# Altium footprint library 我的器件.PCBLIB: 450 footprints (part 23 of 29)
Each footprint in its own frame and in the unit in brackets; x right, y up, seen from the top. Pads: shape width x height; smd on the part's side, far side on the other; paste and mask are expansions set on the pad; w line width, h text height; cw(c..) or ccw(c..) is an arc to the next point about the centre after c.
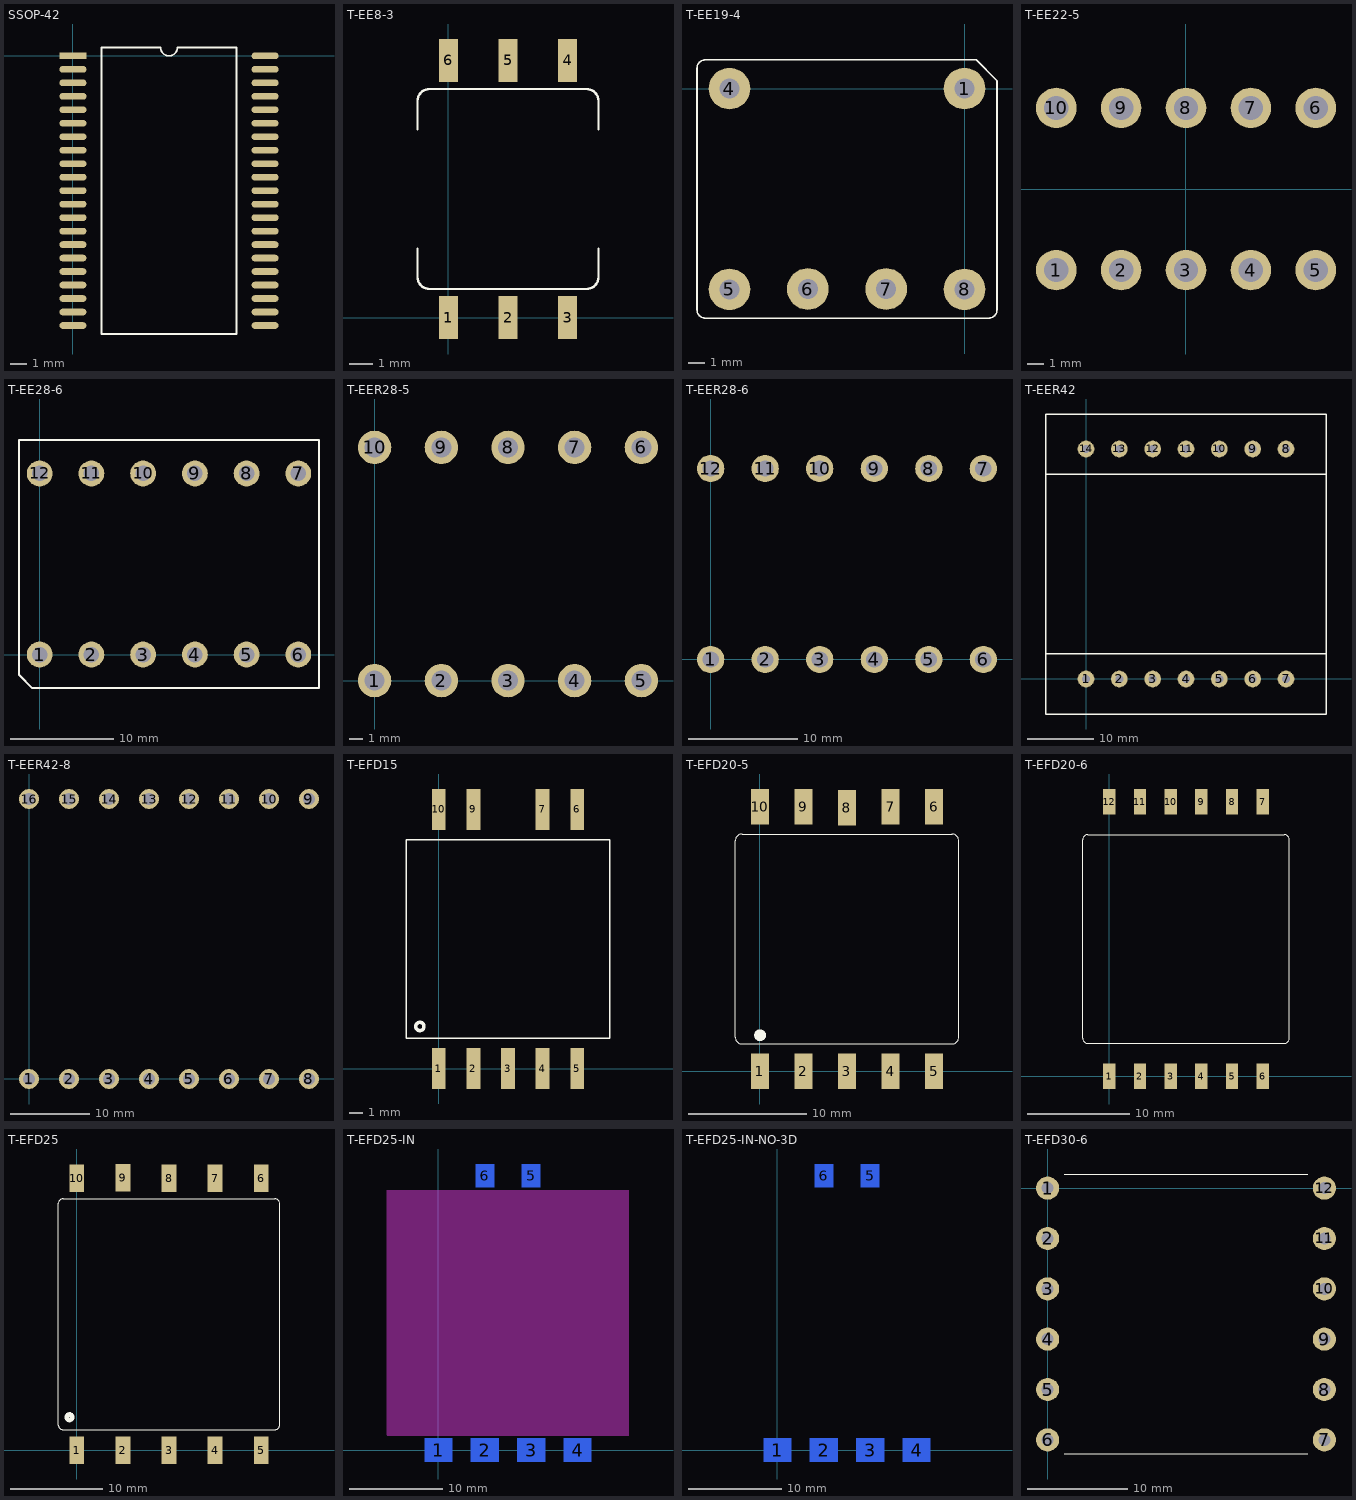
[diagram p22: the footprints below, top view; thin cyan lines are the x and y axes]

## SSOP-42 [mm]
pads (42):
  rect 1.6x0.4 smd: 1(0,0)
  oval 1.6x0.4 smd: 2(0,-0.8) 3(0,-1.6) 4(0,-2.4) 5(0,-3.2) 6(0,-4) 7(0,-4.8) 8(0,-5.6) 9(0,-6.4) 10(0,-7.2) 11(0,-8) 12(0,-8.8) 13(0,-9.6) 14(0,-10.4) 15(0,-11.2) 16(0,-12) 17(0,-12.8) 18(0,-13.6) 19(0,-14.4) 20(0,-15.2) 21(0,-16) 22(11.4,-16) 23(11.4,-15.2) 24(11.4,-14.4) 25(11.4,-13.6) 26(11.4,-12.8) 27(11.4,-12) 28(11.4,-11.2) 29(11.4,-10.4) 30(11.4,-9.6) 31(11.4,-8.8) 32(11.4,-8) 33(11.4,-7.2) 34(11.4,-6.4) 35(11.4,-5.6) 36(11.4,-4.8) 37(11.4,-4) 38(11.4,-3.2) 39(11.4,-2.4) 40(11.4,-1.6) 41(11.4,-0.8) 42(11.4,0)
Top Overlay:
  lines w0.1: 1.7,-16.5 9.7,-16.5 9.7,0.5 6.2,0.5 cw(c5.7,0.5) 5.7,0 cw(c5.7,0.5) 5.2,0.5 1.7,0.5 1.7,-16.5
3D body: height 1.1, standoff 0.9, extent 9.9,-0.2 10.5,0.201
3D body: height 1.1, standoff 0, extent 10.5,-0.2 10.7,0.2
3D body: height 0.2, standoff 0, extent 10.7,-0.2 11.7,0.2
3D body: height 0.2, standoff 0, extent 10.7,-1 11.7,-0.6
3D body: height 1.1, standoff 0, extent 10.5,-1 10.7,-0.6
3D body: height 1.1, standoff 0.9, extent 9.9,-1 10.5,-0.599
3D body: height 0.2, standoff 0, extent 10.7,-1.8 11.7,-1.4
3D body: height 1.1, standoff 0, extent 10.5,-1.8 10.7,-1.4
3D body: height 1.1, standoff 0.9, extent 9.9,-1.8 10.5,-1.399
3D body: height 0.2, standoff 0, extent 10.7,-2.6 11.7,-2.2
3D body: height 1.1, standoff 0, extent 10.5,-2.6 10.7,-2.2
3D body: height 1.1, standoff 0.9, extent 9.9,-2.6 10.5,-2.199
3D body: height 0.2, standoff 0, extent 10.7,-3.4 11.7,-3
3D body: height 1.1, standoff 0, extent 10.5,-3.4 10.7,-3
3D body: height 1.1, standoff 0.9, extent 9.9,-3.4 10.5,-2.999
3D body: height 1.1, standoff 0.9, extent 9.9,-7.4 10.5,-6.999
3D body: height 1.1, standoff 0, extent 10.5,-7.4 10.7,-7
3D body: height 0.2, standoff 0, extent 10.7,-7.4 11.7,-7
3D body: height 1.1, standoff 0.9, extent 9.9,-6.6 10.5,-6.199
3D body: height 1.1, standoff 0, extent 10.5,-6.6 10.7,-6.2
3D body: height 0.2, standoff 0, extent 10.7,-6.6 11.7,-6.2
3D body: height 1.1, standoff 0.9, extent 9.9,-5.8 10.5,-5.399
3D body: height 1.1, standoff 0, extent 10.5,-5.8 10.7,-5.4
3D body: height 0.2, standoff 0, extent 10.7,-5.8 11.7,-5.4
3D body: height 1.1, standoff 0.9, extent 9.9,-5 10.5,-4.599
3D body: height 1.1, standoff 0, extent 10.5,-5 10.7,-4.6
3D body: height 0.2, standoff 0, extent 10.7,-5 11.7,-4.6
3D body: height 0.2, standoff 0, extent 10.7,-4.2 11.7,-3.8
3D body: height 1.1, standoff 0, extent 10.5,-4.2 10.7,-3.8
3D body: height 1.1, standoff 0.9, extent 9.9,-4.2 10.5,-3.799
3D body: height 1.1, standoff 0.9, extent 9.9,-11.4 10.5,-10.999
3D body: height 1.1, standoff 0, extent 10.5,-11.4 10.7,-11
3D body: height 0.2, standoff 0, extent 10.7,-11.4 11.7,-11
3D body: height 1.1, standoff 0.9, extent 9.9,-10.6 10.5,-10.199
3D body: height 1.1, standoff 0, extent 10.5,-10.6 10.7,-10.2
3D body: height 0.2, standoff 0, extent 10.7,-10.6 11.7,-10.2
3D body: height 1.1, standoff 0.9, extent 9.9,-9.8 10.5,-9.399
3D body: height 1.1, standoff 0, extent 10.5,-9.8 10.7,-9.4
3D body: height 0.2, standoff 0, extent 10.7,-9.8 11.7,-9.4
3D body: height 1.1, standoff 0.9, extent 9.9,-9 10.5,-8.599
3D body: height 1.1, standoff 0, extent 10.5,-9 10.7,-8.6
3D body: height 0.2, standoff 0, extent 10.7,-9 11.7,-8.6
3D body: height 0.2, standoff 0, extent 10.7,-8.2 11.7,-7.8
3D body: height 1.1, standoff 0, extent 10.5,-8.2 10.7,-7.8
3D body: height 1.1, standoff 0.9, extent 9.9,-8.2 10.5,-7.799
3D body: height 1.1, standoff 0.9, extent 9.9,-15.4 10.5,-14.999
3D body: height 1.1, standoff 0, extent 10.5,-15.4 10.7,-15
3D body: height 0.2, standoff 0, extent 10.7,-15.4 11.7,-15
3D body: height 1.1, standoff 0.9, extent 9.9,-14.6 10.5,-14.199
3D body: height 1.1, standoff 0, extent 10.5,-14.6 10.7,-14.2
3D body: height 0.2, standoff 0, extent 10.7,-14.6 11.7,-14.2
3D body: height 1.1, standoff 0.9, extent 9.9,-13.8 10.5,-13.399
3D body: height 1.1, standoff 0, extent 10.5,-13.8 10.7,-13.4
3D body: height 0.2, standoff 0, extent 10.7,-13.8 11.7,-13.4
3D body: height 1.1, standoff 0.9, extent 9.9,-13 10.5,-12.599
3D body: height 1.1, standoff 0, extent 10.5,-13 10.7,-12.6
3D body: height 0.2, standoff 0, extent 10.7,-13 11.7,-12.6
3D body: height 0.2, standoff 0, extent 10.7,-12.2 11.7,-11.8
3D body: height 1.1, standoff 0, extent 10.5,-12.2 10.7,-11.8
3D body: height 1.1, standoff 0.9, extent 9.9,-12.2 10.5,-11.799
3D body: height 0.2, standoff 0, extent 10.7,-16.2 11.7,-15.8
3D body: height 1.1, standoff 0, extent 10.5,-16.2 10.7,-15.8
3D body: height 1.1, standoff 0.9, extent 9.9,-16.2 10.5,-15.799
3D body: height 1.1, standoff 0.9, extent 0.9,-16.2 1.5,-15.799
3D body: height 1.1, standoff 0, extent 0.7,-16.2 0.9,-15.8
3D body: height 0.2, standoff 0, extent -0.3,-16.2 0.7,-15.8
3D body: height 1.1, standoff 0.9, extent 0.9,-12.2 1.5,-11.799
3D body: height 1.1, standoff 0, extent 0.7,-12.2 0.9,-11.8
3D body: height 0.2, standoff 0, extent -0.3,-12.2 0.7,-11.8
3D body: height 0.2, standoff 0, extent -0.3,-13 0.7,-12.6
3D body: height 1.1, standoff 0, extent 0.7,-13 0.9,-12.6
3D body: height 1.1, standoff 0.9, extent 0.9,-13 1.5,-12.599
3D body: height 0.2, standoff 0, extent -0.3,-13.8 0.7,-13.4
3D body: height 1.1, standoff 0, extent 0.7,-13.8 0.9,-13.4
3D body: height 1.1, standoff 0.9, extent 0.9,-13.8 1.5,-13.399
3D body: height 0.2, standoff 0, extent -0.3,-14.6 0.7,-14.2
3D body: height 1.1, standoff 0, extent 0.7,-14.6 0.9,-14.2
3D body: height 1.1, standoff 0.9, extent 0.9,-14.6 1.5,-14.199
3D body: height 0.2, standoff 0, extent -0.3,-15.4 0.7,-15
3D body: height 1.1, standoff 0, extent 0.7,-15.4 0.9,-15
3D body: height 1.1, standoff 0.9, extent 0.9,-15.4 1.5,-14.999
3D body: height 1.1, standoff 0.9, extent 0.9,-8.2 1.5,-7.799
3D body: height 1.1, standoff 0, extent 0.7,-8.2 0.9,-7.8
3D body: height 0.2, standoff 0, extent -0.3,-8.2 0.7,-7.8
3D body: height 0.2, standoff 0, extent -0.3,-9 0.7,-8.6
3D body: height 1.1, standoff 0, extent 0.7,-9 0.9,-8.6
3D body: height 1.1, standoff 0.9, extent 0.9,-9 1.5,-8.599
3D body: height 0.2, standoff 0, extent -0.3,-9.8 0.7,-9.4
3D body: height 1.1, standoff 0, extent 0.7,-9.8 0.9,-9.4
3D body: height 1.1, standoff 0.9, extent 0.9,-9.8 1.5,-9.399
3D body: height 0.2, standoff 0, extent -0.3,-10.6 0.7,-10.2
3D body: height 1.1, standoff 0, extent 0.7,-10.6 0.9,-10.2
3D body: height 1.1, standoff 0.9, extent 0.9,-10.6 1.5,-10.199
3D body: height 0.2, standoff 0, extent -0.3,-11.4 0.7,-11
3D body: height 1.1, standoff 0, extent 0.7,-11.4 0.9,-11
3D body: height 1.1, standoff 0.9, extent 0.9,-11.4 1.5,-10.999
3D body: height 1.1, standoff 0.9, extent 0.9,-4.2 1.5,-3.799
3D body: height 1.1, standoff 0, extent 0.7,-4.2 0.9,-3.8
3D body: height 0.2, standoff 0, extent -0.3,-4.2 0.7,-3.8
3D body: height 0.2, standoff 0, extent -0.3,-5 0.7,-4.6
3D body: height 1.1, standoff 0, extent 0.7,-5 0.9,-4.6
3D body: height 1.1, standoff 0.9, extent 0.9,-5 1.5,-4.599
3D body: height 0.2, standoff 0, extent -0.3,-5.8 0.7,-5.4
3D body: height 1.1, standoff 0, extent 0.7,-5.8 0.9,-5.4
3D body: height 1.1, standoff 0.9, extent 0.9,-5.8 1.5,-5.399
3D body: height 0.2, standoff 0, extent -0.3,-6.6 0.7,-6.2
3D body: height 1.1, standoff 0, extent 0.7,-6.6 0.9,-6.2
3D body: height 1.1, standoff 0.9, extent 0.9,-6.6 1.5,-6.199
3D body: height 0.2, standoff 0, extent -0.3,-7.4 0.7,-7
3D body: height 1.1, standoff 0, extent 0.7,-7.4 0.9,-7
3D body: height 1.1, standoff 0.9, extent 0.9,-7.4 1.5,-6.999
3D body: height 1.1, standoff 0.9, extent 0.9,-3.4 1.5,-2.999
3D body: height 1.1, standoff 0, extent 0.7,-3.4 0.9,-3
3D body: height 0.2, standoff 0, extent -0.3,-3.4 0.7,-3
3D body: height 1.1, standoff 0.9, extent 0.9,-2.6 1.5,-2.199
3D body: height 1.1, standoff 0, extent 0.7,-2.6 0.9,-2.2
3D body: height 0.2, standoff 0, extent -0.3,-2.6 0.7,-2.2
3D body: height 1.1, standoff 0.9, extent 0.9,-1.8 1.5,-1.399
3D body: height 1.1, standoff 0, extent 0.7,-1.8 0.9,-1.4
3D body: height 0.2, standoff 0, extent -0.3,-1.8 0.7,-1.4
3D body: height 1.1, standoff 0.9, extent 0.9,-1 1.5,-0.599
3D body: height 1.1, standoff 0, extent 0.7,-1 0.9,-0.6
3D body: height 0.2, standoff 0, extent -0.3,-1 0.7,-0.6
3D body: height 0.2, standoff 0, extent -0.3,-0.2 0.7,0.2
3D body: height 1.1, standoff 0, extent 0.7,-0.2 0.9,0.2
3D body: height 1.1, standoff 0.9, extent 0.9,-0.2 1.5,0.201
3D body: height 2.1, standoff 0.1, extent 1.45,-16.75 9.95,0.75
3D body: height 2.11, standoff 2.1, extent 2.103,-0.799 2.9,-0.001

## T-EE8-3 [mm]
pads (6):
  rect 0.8x1.8 smd: 1(0,0) 2(2.5,0) 3(5,0) 4(5,10.8) 5(2.5,10.8) 6(0,10.8)
Top Overlay:
  lines w0.1: -1.3,2.9 -1.3,1.7 ccw(c-0.8,1.7) -0.8,1.2 5.8,1.2 ccw(c5.8,1.7) 6.3,1.7 6.3,2.9 ; -1.3,7.9 -1.3,9.1 cw(c-0.8,9.1) -0.8,9.6 5.8,9.6 cw(c5.8,9.1) 6.3,9.1 6.3,7.9
3D body: height 5.41, standoff 1.59, extent 5.675,5.375 6.725,5.425
3D body: height 5.41, standoff 1.59, extent -1.725,5.375 -0.675,5.425
3D body: height 6, standoff 1, extent 0.001,3.1 5.001,7.7
3D body: height 6.6, standoff 0.4, extent 0.601,3.1 4.399,7.7
3D body: height 1.6, standoff 0.4, extent 3.8,3.1 4.999,7.7
3D body: height 1.6, standoff 0.4, extent 0.001,3.1 1.2,7.7
3D body: height 6.6, standoff 5.4, extent 3.8,3.1 4.999,7.7
3D body: height 1.6, standoff 0.9, extent -1.8,0.9 6.8,3.1
3D body: height 0.9, standoff 0.2, extent -0.8,0.9 0.8,3.1
3D body: height 0.9, standoff 0.2, extent 1.8,0.9 3.2,3.1
3D body: height 0.9, standoff 0.2, extent 4.2,0.9 5.8,3.1
3D body: height 6.8, standoff 1.6, extent -0.3,2.6 5.3,3.1
3D body: height 6.6, standoff 5.4, extent 0.001,3.1 1.2,7.7
3D body: height 6.8, standoff 1.6, extent -0.3,7.7 5.3,8.2
3D body: height 0.9, standoff 0.2, extent -0.8,7.7 0.8,9.9
3D body: height 0.9, standoff 0.2, extent 1.8,7.7 3.2,9.9
3D body: height 0.9, standoff 0.2, extent 4.2,7.7 5.8,9.9
3D body: height 1.6, standoff 0.9, extent -1.8,7.7 6.8,9.9
3D body: height 1, standoff 0.7, extent 2.2,9.9 2.8,10.55
3D body: height 1, standoff 0, extent 2.2,10.4 2.8,10.7
3D body: height 0.3, standoff 0, extent 2.2,10.55 2.8,11.6
3D body: height 0.3, standoff 0, extent -0.3,10.55 0.3,11.6
3D body: height 1, standoff 0, extent -0.3,10.4 0.3,10.7
3D body: height 1, standoff 0.7, extent -0.3,9.9 0.3,10.55
3D body: height 0.3, standoff 0, extent 4.7,10.55 5.3,11.6
3D body: height 1, standoff 0, extent 4.7,10.4 5.3,10.7
3D body: height 1, standoff 0.7, extent 4.7,9.9 5.3,10.55
3D body: height 0.3, standoff 0, extent -0.3,-0.8 0.3,0.25
3D body: height 1, standoff 0, extent -0.3,0.1 0.3,0.4
3D body: height 1, standoff 0.7, extent -0.3,0.25 0.3,0.9
3D body: height 0.3, standoff 0, extent 2.2,-0.8 2.8,0.25
3D body: height 1, standoff 0, extent 2.2,0.1 2.8,0.4
3D body: height 1, standoff 0.7, extent 2.2,0.25 2.8,0.9
3D body: height 0.3, standoff 0, extent 4.7,-0.8 5.3,0.25
3D body: height 1, standoff 0, extent 4.7,0.1 5.3,0.4
3D body: height 1, standoff 0.7, extent 4.7,0.25 5.3,0.9
3D body: height 5.4, standoff 1.6, extent -1.7,1.2 6.7,5.4
3D body: height 5.4, standoff 1.6, extent -1.7,5.4 6.7,9.6

## T-EE19-4 [mm]
pads (6):
  round 2.5 hole 1.2: 1(0,0) 4(-14.1,0) 5(-14.1,-12.05) 6(-9.4,-12.025) 7(-4.7,-12.025) 8(0,-12.05)
Top Overlay:
  lines w0.1: -16.05,-13.275 ccw(c-15.55,-13.275) -15.55,-13.775 1.45,-13.775 ccw(c1.45,-13.275) 1.95,-13.275 1.95,0.475 0.7,1.725 -15.55,1.725 ccw(c-15.55,1.225) -16.05,1.225 -16.05,-13.275
3D body: height 14.45, standoff 1.5, extent -13.537,-10.525 -0.563,-1.525
3D body: height 1.4, standoff 0, extent -8.05,-11.525 -6.05,-10.525
3D body: height 1.4, standoff 0, extent -16.55,-11.525 -14.55,-10.525
3D body: height 1.4, standoff 0, extent -12.1,-11.525 -10.1,-10.525
3D body: height 1.4, standoff 0, extent -4,-11.525 -2,-10.525
3D body: height 1.4, standoff 0, extent 0.45,-11.525 2.45,-10.525
3D body: height 14.6, standoff 5.7, extent -13.75,-11.525 -0.35,-10.525
3D body: height 14.6, standoff 10.9, extent -13.75,-12.525 -0.35,-10.525
3D body: height 3, standoff -2, extent -14.398,-12.349 -13.8,-11.751
3D body: height 3, standoff -2, extent -9.697,-12.324 -9.1,-11.725
3D body: height 3, standoff -2, extent -4.997,-12.324 -4.4,-11.725
3D body: height 3, standoff -2, extent -0.297,-12.349 0.3,-11.75
3D body: height 3, standoff -2, extent -14.4,-0.3 -13.803,0.299
3D body: height 3, standoff -2, extent -0.3,-0.299 0.298,0.299
3D body: height 14.6, standoff 10.9, extent -13.75,-1.525 -0.35,0.475
3D body: height 14.6, standoff 5.7, extent -13.75,-1.525 -0.35,-0.525
3D body: height 1.4, standoff 0, extent -16.55,-1.525 -14.55,-0.525
3D body: height 1.4, standoff 0, extent -12.1,-1.525 -10.1,-0.525
3D body: height 1.4, standoff 0, extent -4,-1.525 -2,-0.525
3D body: height 1.4, standoff 0, extent 0.45,-1.525 2.45,-0.525
3D body: height 1.4, standoff 0, extent -8.05,-1.525 -6.05,-0.525
3D body: height 10.3, standoff 5.9, extent -16.55,-6.025 2.45,2.175
3D body: height 10.3, standoff 5.9, extent -16.55,-14.225 2.45,-6.025
3D body: height 10.31, standoff 5.89, extent 0.125,-6.05 2.475,-6
3D body: height 10.31, standoff 5.89, extent -16.575,-6.05 -14.225,-6
3D body: height 5.7, standoff 1.4, extent -16.55,-13.925 2.45,-10.525
3D body: height 5.7, standoff 1.4, extent -16.55,-1.525 2.45,1.875

## T-EE22-5 [mm]
pads (10):
  round 2.5 hole 1.5: 1(-8,-5) 2(-4,-5) 3(0,-5) 4(4,-5) 5(8,-5) 6(8,5) 7(4,5) 8(0,5) 9(-4,5) 10(-8,5)
3D body: height 19.3, standoff 16.8, extent -6.65,3.004 6.556,6.51
3D body: height 19.3, standoff 16.8, extent -6.65,-6.696 6.55,-3.196
3D body: height 17, standoff 16.8, extent -6.65,-6.696 6.55,6.504
3D body: height 16.8, standoff 7.7, extent -6.25,-6.25 6.25,6.25
3D body: height 21, standoff 17, extent -11.25,-3 11.25,3
3D body: height 7.8, standoff 3.2, extent -11.1,-8 11.1,8
3D body: height 5.2, standoff 1.2, extent -11.25,-3 11.25,3
3D body: height 19, standoff 1.2, extent -11.25,-3 -8.25,3
3D body: height 19, standoff 1.2, extent 8.25,-3 11.25,3
3D body: height 3, standoff -2, extent -8.496,-5.499 -7.5,-4.501
3D body: height 3, standoff -2, extent -4.496,-5.499 -3.5,-4.501
3D body: height 3, standoff -2, extent -0.496,-5.499 0.5,-4.501
3D body: height 3, standoff -2, extent 3.504,-5.499 4.5,-4.501
3D body: height 3, standoff -2, extent 7.504,-5.499 8.5,-4.501
3D body: height 3, standoff -2, extent 7.504,4.501 8.5,5.499
3D body: height 3, standoff -2, extent 3.504,4.501 4.5,5.499
3D body: height 3, standoff -2, extent -0.496,4.501 0.5,5.499
3D body: height 3, standoff -2, extent -4.496,4.501 -3.5,5.499
3D body: height 3, standoff -2, extent -8.496,4.501 -7.5,5.499
3D body: height 3.2, standoff 0, extent -11.1,-3.7 11.1,-3.1
3D body: height 3.2, standoff 0, extent -11.1,3.1 11.1,3.7
3D body: height 21.1, standoff 21, extent -11.25,-3 11.25,3
3D body: height 21.1, standoff 0, extent -11.35,-3 -11.25,3
3D body: height 21.1, standoff 0, extent 11.25,-3 11.35,3
3D body: height 0.09, standoff -0.01, extent -11.25,-3 11.25,3

## T-EE28-6 [mm]
height 28
pads (12):
  round 2.5 hole 1.5: 1(0,0) 2(5,0) 3(10,0) 4(15,0) 5(20,0) 6(25,0) 7(25,17.5) 8(20,17.5) 9(15,17.5) 10(10,17.5) 11(5,17.5) 12(0,17.5)
Top Overlay:
  lines w0.2: -2,-1.958 -0.708,-3.25 27,-3.25 27,20.75 -2,20.75 -2,-1.958

## T-EER28-5 [mm]
pads (10):
  round 2.5 hole 1.5: 1(0,0) 2(5,0) 3(10,0) 4(15,0) 5(20,0) 6(20,17.5) 7(15,17.5) 8(10,17.5) 9(5,17.5) 10(0,17.5)
3D body: height 3, standoff -2, extent -0.496,-0.499 0.5,0.499
3D body: height 3, standoff -2, extent 4.504,-0.499 5.5,0.499
3D body: height 3, standoff -2, extent 9.504,-0.499 10.5,0.499
3D body: height 3, standoff -2, extent 14.504,-0.499 15.5,0.499
3D body: height 3, standoff -2, extent 19.504,-0.499 20.5,0.499
3D body: height 3, standoff -2, extent 19.504,17.001 20.5,17.999
3D body: height 3, standoff -2, extent 14.504,17.001 15.5,17.999
3D body: height 3, standoff -2, extent 9.504,17.001 10.5,17.999
3D body: height 3, standoff -2, extent 4.504,17.001 5.5,17.999
3D body: height 3, standoff -2, extent -0.496,17.001 0.5,17.999
3D body: height 4.5, standoff 0, extent -5.325,2.5 25.275,15
3D body: height 35, standoff 0, extent 20.775,2.5 25.275,15
3D body: height 35, standoff 0, extent -5.325,2.5 -0.825,15
3D body: height 35, standoff 30.5, extent -5.325,2.5 25.275,15
3D body: height 30.5, standoff 28.5, extent -0.417,-1.729 20.5,19.229
3D body: height 29, standoff 7, extent 1.071,-0.232 19,17.732
3D body: height 35.1, standoff 35, extent -5.325,2.5 25.275,15
3D body: height 35.1, standoff 0, extent -5.425,2.5 -5.325,15
3D body: height 35.1, standoff 0, extent 25.275,2.5 25.375,15
3D body: height 0, standoff -0.1, extent -5.4,2.5 25.4,15
3D body: height 6.7, standoff 2, extent -5,-4.35 25,21.85

## T-EER28-6 [mm]
pads (12):
  round 2.5 hole 1.5: 1(0,0) 2(5,0) 3(10,0) 4(15,0) 5(20,0) 6(25,0) 7(25,17.5) 8(20,17.5) 9(15,17.5) 10(10,17.5) 11(5,17.5) 12(0,17.5)
3D body: height 6.7, standoff 2, extent -2.7,-4.55 27.7,22.05
3D body: height 3, standoff -2, extent -0.496,-0.499 0.5,0.499
3D body: height 3, standoff -2, extent 4.504,-0.499 5.5,0.499
3D body: height 3, standoff -2, extent 9.504,-0.499 10.5,0.499
3D body: height 3, standoff -2, extent 14.504,-0.499 15.5,0.499
3D body: height 3, standoff -2, extent 19.504,-0.499 20.5,0.499
3D body: height 3, standoff -2, extent 24.504,-0.499 25.5,0.499
3D body: height 3, standoff -2, extent 24.504,17.001 25.5,17.999
3D body: height 3, standoff -2, extent 19.504,17.001 20.5,17.999
3D body: height 3, standoff -2, extent 14.504,17.001 15.5,17.999
3D body: height 3, standoff -2, extent 9.504,17.001 10.5,17.999
3D body: height 3, standoff -2, extent 4.504,17.001 5.5,17.999
3D body: height 3, standoff -2, extent -0.496,17.001 0.5,17.999
3D body: height 4.5, standoff 0, extent -2.8,2.55 27.8,15.05
3D body: height 35, standoff 0, extent -2.8,2.55 1.7,15.05
3D body: height 35, standoff 0, extent 23.3,2.55 27.8,15.05
3D body: height 35, standoff 30.5, extent -2.8,2.55 27.8,15.05
3D body: height 30.5, standoff 28.5, extent 2.083,-1.729 23,19.229
3D body: height 29, standoff 7, extent 3.571,-0.232 21.5,17.732
3D body: height 35.1, standoff 35, extent -2.8,2.55 27.8,15.05
3D body: height 35.1, standoff 0, extent -2.9,2.55 -2.8,15.05
3D body: height 35.1, standoff 0, extent 27.8,2.55 27.9,15.05
3D body: height 0, standoff -0.1, extent -2.9,2.55 27.9,15.05

## T-EER42 [mm]
height 35
pads (14):
  round 2.5 hole 1.2: 1(0,0) 2(5,0) 3(10,0) 4(15,0) 5(20,0) 6(25,0) 7(30,0) 8(30,34.5) 9(25,34.5) 10(20,34.5) 11(15,34.5) 12(10,34.5) 13(5,34.5) 14(0,34.5)
Top Overlay:
  lines w0.2: -6,3.788 36,3.788 ; -6,30.712 36,30.712 ; -6,-5.25 36,-5.25 36,39.75 -6,39.75 -6,-5.25

## T-EER42-8 [mm]
pads (16):
  round 2.5 hole 1.5: 1(0,0) 2(5,0) 3(10,0) 4(15,0) 5(20,0) 6(25,0) 7(30,0) 8(35,0) 9(35,35) 10(30,35) 11(25,35) 12(20,35) 13(15,35) 14(10,35) 15(5,35) 16(0,35)
3D body: height 28, standoff 13.3, extent -4.9,40.2 39.9,40.3
3D body: height 28, standoff 13.3, extent -4.9,-5.3 39.9,-5.2
3D body: height 28, standoff 13.3, extent -4.9,-5.2 -4.8,40.2
3D body: height 13, standoff 0, extent -2,31.5 0.75,34.2
3D body: height 13, standoff 0, extent 34.3,31.5 37,34.25
3D body: height 28, standoff 13.3, extent 39.8,-5.2 39.9,40.2
3D body: height 35.27, standoff 7.33, extent 3.555,31.6 31.445,32.6
3D body: height 27.79, standoff 14.81, extent 10.926,1.8 23.874,33.2
3D body: height 28, standoff 13.3, extent -4.8,-5.2 39.8,40.2
3D body: height 13, standoff 8.5, extent -2,-2 37,3.5
3D body: height 8.5, standoff 5, extent 33,-2 37,3.5
3D body: height 5, standoff -2, extent 34.603,-0.399 35.4,0.399
3D body: height 8.5, standoff 5, extent 28,-2 32,3.5
3D body: height 5, standoff -2, extent 29.603,-0.399 30.4,0.399
3D body: height 8.5, standoff 5, extent 23,-2 27,3.5
3D body: height 5, standoff -2, extent 24.603,-0.399 25.4,0.399
3D body: height 8.5, standoff 5, extent 18,-2 22,3.5
3D body: height 5, standoff -2, extent 19.603,-0.399 20.4,0.399
3D body: height 8.5, standoff 5, extent 13,-2 17,3.5
3D body: height 5, standoff -2, extent 14.603,-0.399 15.4,0.399
3D body: height 8.5, standoff 5, extent 8,-2 12,3.5
3D body: height 5, standoff -2, extent 9.603,-0.399 10.4,0.399
3D body: height 8.5, standoff 5, extent 3,-2 7,3.5
3D body: height 5, standoff -2, extent 4.603,-0.399 5.4,0.399
3D body: height 5, standoff -2, extent -0.397,-0.399 0.4,0.399
3D body: height 8.5, standoff 5, extent -2,-2 2,3.5
3D body: height 13, standoff 11.5, extent -2,-4.5 37,3.5
3D body: height 13, standoff 0, extent -2,0.75 0.7,3.5
3D body: height 35.27, standoff 7.33, extent 3.555,2.5 31.445,3.5
3D body: height 13, standoff 11.5, extent -2,31.5 37,39.5
3D body: height 8.5, standoff 5, extent 33,31.5 37,37
3D body: height 5, standoff -2, extent 34.6,34.601 35.397,35.399
3D body: height 5, standoff -2, extent 29.6,34.601 30.397,35.399
3D body: height 8.5, standoff 5, extent 28,31.5 32,37
3D body: height 5, standoff -2, extent 24.6,34.601 25.397,35.399
3D body: height 8.5, standoff 5, extent 23,31.5 27,37
3D body: height 5, standoff -2, extent 19.6,34.601 20.397,35.399
3D body: height 8.5, standoff 5, extent 18,31.5 22,37
3D body: height 5, standoff -2, extent 14.6,34.601 15.397,35.399
3D body: height 8.5, standoff 5, extent 13,31.5 17,37
3D body: height 5, standoff -2, extent 9.6,34.601 10.397,35.399
3D body: height 8.5, standoff 5, extent 8,31.5 12,37
3D body: height 5, standoff -2, extent 4.6,34.601 5.397,35.399
3D body: height 8.5, standoff 5, extent 3,31.5 7,37
3D body: height 5, standoff -2, extent -0.4,34.601 0.397,35.399
3D body: height 8.5, standoff 5, extent -2,31.5 2,37
3D body: height 13, standoff 8.5, extent -2,31.5 37,37
3D body: height 33.28, standoff 9.32, extent 5.547,3.5 29.453,31.5
3D body: height 28.1, standoff 15.4, extent 31.5,17.4 39.8,17.6
3D body: height 28.1, standoff 15.4, extent -4.8,17.4 3.5,17.6
3D body: height 13, standoff 0, extent 34.25,0.8 37,3.5

## T-EFD15 [mm] "SMD"
height 8
pads (9):
  rect 1x3 smd: 1(0,0) 2(2.54,0) 3(5.08,0) 4(7.62,0) 5(10.16,0) 6(10.16,19.069) 7(7.62,19.069) 9(2.54,19.069) 10(0,19.069)
Top Overlay:
  circle w0.254: c-1.404,3.1 r0.304
  lines w0.1: -2.42,2.234 -2.42,16.835 -1.92,16.835 12.58,16.835 12.58,2.234 -2.42,2.234
3D body: height 8, standoff 3.2, extent -2.945,17.334 13.105,17.36
3D body: height 8, standoff 3.2, extent -2.945,1.709 13.105,1.734
3D body: height 8, standoff 3.2, extent -2.945,1.734 -2.92,17.334
3D body: height 8, standoff 1, extent -0.02,13.934 10.18,14.634
3D body: height 8, standoff 1, extent -0.02,4.434 10.18,5.134
3D body: height 7, standoff 5.5, extent 2.88,15.234 7.28,17.334
3D body: height 7, standoff 5.5, extent 2.88,1.734 7.28,3.835
3D body: height 8, standoff 5.5, extent 7.28,1.734 13.08,17.334
3D body: height 8, standoff 5.5, extent -2.92,1.734 2.88,17.334
3D body: height 5.5, standoff 3.2, extent -2.92,1.734 13.08,17.334
3D body: height 0.5, standoff 0, extent -0.3,-1.2 0.3,0.8
3D body: height 2.5, standoff 0, extent -0.3,0.8 0.3,1.3
3D body: height 2.5, standoff 2, extent -0.3,1.3 0.3,3.103
3D body: height 3.2, standoff 1, extent -1.57,2.134 11.73,5.134
3D body: height 3.2, standoff 1, extent -1.57,13.934 11.73,16.934
3D body: height 2.5, standoff 2, extent -0.3,15.966 0.3,17.769
3D body: height 2.5, standoff 0, extent -0.3,17.769 0.3,18.269
3D body: height 0.5, standoff 0, extent -0.3,18.269 0.3,20.269
3D body: height 2.5, standoff 2, extent 2.24,15.966 2.84,17.769
3D body: height 2.5, standoff 0, extent 2.24,17.769 2.84,18.269
3D body: height 0.5, standoff 0, extent 2.24,18.269 2.84,20.269
3D body: height 2.5, standoff 2, extent 7.32,15.966 7.92,17.769
3D body: height 2.5, standoff 0, extent 7.32,17.769 7.92,18.269
3D body: height 0.5, standoff 0, extent 7.32,18.269 7.92,20.269
3D body: height 2.5, standoff 2, extent 9.86,15.966 10.46,17.769
3D body: height 2.5, standoff 0, extent 9.86,17.769 10.46,18.269
3D body: height 0.5, standoff 0, extent 9.86,18.269 10.46,20.269
3D body: height 2.5, standoff 2, extent 2.24,1.3 2.84,3.103
3D body: height 2.5, standoff 0, extent 2.24,0.8 2.84,1.3
3D body: height 0.5, standoff 0, extent 2.24,-1.2 2.84,0.8
3D body: height 2.5, standoff 2, extent 4.78,1.3 5.38,3.103
3D body: height 2.5, standoff 0, extent 4.78,0.8 5.38,1.3
3D body: height 0.5, standoff 0, extent 4.78,-1.2 5.38,0.8
3D body: height 2.5, standoff 2, extent 7.32,1.3 7.92,3.103
3D body: height 2.5, standoff 0, extent 7.32,0.8 7.92,1.3
3D body: height 0.5, standoff 0, extent 7.32,-1.2 7.92,0.8
3D body: height 2.5, standoff 2, extent 9.86,1.3 10.46,3.103
3D body: height 2.5, standoff 0, extent 9.86,0.8 10.46,1.3
3D body: height 0.5, standoff 0, extent 9.86,-1.2 10.46,0.8
3D body: height 7.79, standoff 1.01, extent 0.68,5.135 7.453,13.935
3D body: height 7.79, standoff 1.01, extent 2.707,5.135 9.48,13.935
3D body: height 7.8, standoff 1, extent 4.067,5.134 6.093,13.934
3D body: height 8, standoff 3.2, extent 13.08,1.734 13.105,17.334
3D body: height 8.01, standoff 3.19, extent 10.955,9.484 13.08,9.585
3D body: height 8.01, standoff 3.19, extent -2.92,9.484 -0.795,9.585

## T-EFD20-5 [mm]
pads (10):
  rect 1.5x3 smd: 1(0,0) 2(3.7,0) 3(7.4,0) 4(11.1,0) 5(14.8,0) 6(14.8,22.5) 7(11.1,22.5) 8(7.4,22.4) 9(3.7,22.5) 10(0,22.5)
Top Overlay:
  circle w0.5: c0.013,3.071 r0.25
  lines w0.1: -1.515,2.335 cw(c-1.515,2.919) -2.1,2.919 -2.1,19.581 cw(c-1.515,19.581) -1.515,20.165 16.341,20.165 ; -1.49,2.335 16.315,2.335 ccw(c16.315,2.919) 16.9,2.919 16.9,19.581 ccw(c16.315,19.581) 16.315,20.165
3D body: height 1.5, standoff 0, extent -0.5,0.346 0.504,0.848
3D body: height 1.5, standoff 1, extent -0.5,0.847 0.5,1.6
3D body: height 0.5, standoff 0, extent -0.5,-1.254 0.504,0.348
3D body: height 9.8, standoff 2.8, extent -0.3,4.25 15.1,5.25
3D body: height 9.4, standoff 2.8, extent 0.9,5.25 13.9,17.25
3D body: height 2.8, standoff 0, extent -3.4,1.55 18.2,4.55
3D body: height 9.8, standoff 2.8, extent -3.4,1.55 18.2,20.95
3D body: height 9.8, standoff 2.8, extent -0.3,17.25 15.1,18.25
3D body: height 2.8, standoff 0, extent -3.4,17.95 18.2,20.95
3D body: height 0.5, standoff 0, extent 3.2,-1.254 4.204,0.348
3D body: height 1.5, standoff 1, extent 3.2,0.847 4.2,1.6
3D body: height 1.5, standoff 0, extent 3.2,0.346 4.204,0.848
3D body: height 0.5, standoff 0, extent 6.9,-1.254 7.904,0.348
3D body: height 1.5, standoff 1, extent 6.9,0.847 7.9,1.6
3D body: height 1.5, standoff 0, extent 6.9,0.346 7.904,0.848
3D body: height 0.5, standoff 0, extent 10.6,-1.254 11.604,0.348
3D body: height 1.5, standoff 1, extent 10.6,0.847 11.6,1.6
3D body: height 1.5, standoff 0, extent 10.6,0.346 11.604,0.848
3D body: height 0.5, standoff 0, extent 14.3,-1.254 15.304,0.348
3D body: height 1.5, standoff 1, extent 14.3,0.847 15.3,1.6
3D body: height 1.5, standoff 0, extent 14.3,0.346 15.304,0.848
3D body: height 0.5, standoff 0, extent 14.296,22.152 15.3,23.754
3D body: height 1.5, standoff 1, extent 14.3,20.9 15.3,21.653
3D body: height 1.5, standoff 0, extent 14.296,21.652 15.3,22.154
3D body: height 0.5, standoff 0, extent 10.596,22.152 11.6,23.754
3D body: height 1.5, standoff 1, extent 10.6,20.9 11.6,21.653
3D body: height 1.5, standoff 0, extent 10.596,21.652 11.6,22.154
3D body: height 0.5, standoff 0, extent 6.896,22.052 7.9,23.654
3D body: height 1.5, standoff 1, extent 6.9,20.8 7.9,21.553
3D body: height 1.5, standoff 0, extent 6.896,21.552 7.9,22.054
3D body: height 0.5, standoff 0, extent 3.196,22.152 4.2,23.754
3D body: height 1.5, standoff 1, extent 3.2,20.9 4.2,21.653
3D body: height 1.5, standoff 0, extent 3.196,21.652 4.2,22.154
3D body: height 0.5, standoff 0, extent -0.504,22.152 0.5,23.754
3D body: height 1.5, standoff 1, extent -0.5,20.9 0.5,21.653
3D body: height 1.5, standoff 0, extent -0.504,21.652 0.5,22.154

## T-EFD20-6 [mm]
pads (12):
  rect 1.2x2.5 smd: 1(0,0) 2(3,0) 3(6,0) 4(9,0) 5(12,0) 6(15,0) 7(15,26.8) 8(12,26.8) 9(9,26.8) 10(6,26.8) 11(3,26.8) 12(0,26.8)
Top Overlay:
  lines w0.1: -2.6,3.7 ccw(c-2.1,3.7) -2.1,3.2 17.1,3.2 ccw(c17.1,3.7) 17.6,3.7 17.6,23.1 ccw(c17.1,23.1) 17.1,23.6 -2.1,23.6 ccw(c-2.1,23.1) -2.6,23.1 -2.6,3.7
3D body: height 10, standoff 3.6, extent 10.2,2.9 18,23.9
3D body: height 8, standoff 3.6, extent 4.8,2.9 10.2,5.3
3D body: height 7, standoff 4.6, extent 3.1,5.3 11.9,21.5
3D body: height 8, standoff 3.6, extent 4.8,21.5 10.2,23.9
3D body: height 10, standoff 3.6, extent -3,2.9 4.8,23.9
3D body: height 10, standoff 1, extent 5,6.4 10,20.4
3D body: height 9.96, standoff 1, extent 5.509,6.4 14.491,20.4
3D body: height 3.5, standoff 1.7, extent -2.55,20.371 17.55,23.898
3D body: height 1.95, standoff 0, extent 11.7,25.2 12.3,25.5
3D body: height 0.35, standoff 0, extent 11.7,25.5 12.3,27.9
3D body: height 1.95, standoff 1.6, extent 11.7,23.1 12.3,25.2
3D body: height 1.95, standoff 0, extent 8.7,25.2 9.3,25.5
3D body: height 0.35, standoff 0, extent 8.7,25.5 9.3,27.9
3D body: height 1.95, standoff 1.6, extent 8.7,23.1 9.3,25.2
3D body: height 1.95, standoff 0, extent 5.7,25.2 6.3,25.5
3D body: height 0.35, standoff 0, extent 5.7,25.5 6.3,27.9
3D body: height 1.95, standoff 1.6, extent 5.7,23.1 6.3,25.2
3D body: height 1.95, standoff 0, extent 2.7,25.2 3.3,25.5
3D body: height 0.35, standoff 0, extent 2.7,25.5 3.3,27.9
3D body: height 1.95, standoff 1.6, extent 2.7,23.1 3.3,25.2
3D body: height 1.95, standoff 0, extent -0.3,25.2 0.3,25.5
3D body: height 0.35, standoff 0, extent -0.3,25.5 0.3,27.9
3D body: height 1.95, standoff 1.6, extent -0.3,23.1 0.3,25.2
3D body: height 10.5, standoff 3.5, extent 0.2,20.367 14.8,20.867
3D body: height 1.7, standoff 0.5, extent 11.1,20.4 12.908,23.904
3D body: height 1.7, standoff 0.5, extent 8.1,20.4 9.908,23.904
3D body: height 1.7, standoff 0.5, extent 5.1,20.4 6.908,23.904
3D body: height 1.7, standoff 0.5, extent 2.1,20.4 3.908,23.904
3D body: height 1.7, standoff 0.5, extent -0.9,20.4 0.908,23.904
3D body: height 1.7, standoff 0.5, extent 14.092,2.896 15.9,6.4
3D body: height 1.7, standoff 0.5, extent 11.092,2.896 12.9,6.4
3D body: height 1.7, standoff 0.5, extent 8.092,2.896 9.9,6.4
3D body: height 1.7, standoff 0.5, extent 5.092,2.896 6.9,6.4
3D body: height 1.7, standoff 0.5, extent 2.092,2.896 3.9,6.4
3D body: height 9.96, standoff 1, extent 0.509,6.4 9.491,20.4
3D body: height 10.5, standoff 3.5, extent 0.2,5.933 14.8,6.433
3D body: height 1.95, standoff 1.6, extent 14.7,1.6 15.3,3.7
3D body: height 0.35, standoff 0, extent 14.7,-1.1 15.3,1.3
3D body: height 1.95, standoff 0, extent 14.7,1.3 15.3,1.6
3D body: height 1.95, standoff 1.6, extent 11.7,1.6 12.3,3.7
3D body: height 0.35, standoff 0, extent 11.7,-1.1 12.3,1.3
3D body: height 1.95, standoff 0, extent 11.7,1.3 12.3,1.6
3D body: height 1.95, standoff 1.6, extent 8.7,1.6 9.3,3.7
3D body: height 0.35, standoff 0, extent 8.7,-1.1 9.3,1.3
3D body: height 1.95, standoff 0, extent 8.7,1.3 9.3,1.6
3D body: height 1.95, standoff 1.6, extent 5.7,1.6 6.3,3.7
3D body: height 0.35, standoff 0, extent 5.7,-1.1 6.3,1.3
3D body: height 1.95, standoff 0, extent 5.7,1.3 6.3,1.6
3D body: height 1.95, standoff 1.6, extent 2.7,1.6 3.3,3.7
3D body: height 0.35, standoff 0, extent 2.7,-1.1 3.3,1.3
3D body: height 1.95, standoff 0, extent 2.7,1.3 3.3,1.6
3D body: height 3.5, standoff 1.7, extent -2.55,2.902 17.55,6.429
3D body: height 1.95, standoff 1.6, extent -0.3,1.6 0.3,3.7
3D body: height 0.35, standoff 0, extent -0.3,-1.1 0.3,1.3
3D body: height 1.95, standoff 0, extent -0.3,1.3 0.3,1.6
3D body: height 1.7, standoff 0.5, extent -0.908,2.896 0.9,6.4
3D body: height 1.7, standoff 0.5, extent 14.1,20.4 15.908,23.904
3D body: height 1.95, standoff 0, extent 14.7,25.2 15.3,25.5
3D body: height 0.35, standoff 0, extent 14.7,25.5 15.3,27.9
3D body: height 1.95, standoff 1.6, extent 14.7,23.1 15.3,25.2

## T-EFD25 [mm]
height 12.8
pads (10):
  rect 1.6x3 smd: 1(0,0) 2(5,0) 3(10,0) 4(15,0) 5(20,0) 6(20,29.5) 7(15,29.5) 8(10,29.5) 9(5,29.55) 10(0,29.5)
Top Overlay:
  circle w0.5: c-0.8,3.575 r0.3
  lines w0.1: -2,2.725 ccw(c-1.5,2.725) -1.5,2.225 21.5,2.225 ccw(c21.5,2.725) 22,2.725 22,26.775 ccw(c21.5,26.775) 21.5,27.275 -1.5,27.275 ccw(c-1.5,26.775) -2,26.775 -2,2.725
3D body: height 4, standoff 2.5, extent -2.4,1.88 22.5,6.38
3D body: height 13.5, standoff 4, extent 1.05,5.581 19.05,6.381
3D body: height 13, standoff 1.5, extent 4.5,6.375 15.5,23.175
3D body: height 2.5, standoff 1, extent 8.5,1.875 11.5,6.375
3D body: height 2.5, standoff 1, extent -2.405,1.88 1.6,6.38
3D body: height 2.5, standoff 1, extent 18.5,1.88 22.505,6.38
3D body: height 2.5, standoff 1, extent 3.5,1.88 6.5,6.38
3D body: height 2.5, standoff 1, extent 13.6,1.88 16.6,6.38
3D body: height 0.4, standoff 0, extent 9.5,-1.125 10.5,0.375
3D body: height 2.5, standoff 0, extent 9.5,0.375 10.5,0.775
3D body: height 2.5, standoff 2.1, extent 9.5,0.775 10.5,1.875
3D body: height 2.5, standoff 2.1, extent 4.5,0.78 5.5,1.88
3D body: height 2.5, standoff 0, extent 4.5,0.38 5.5,0.78
3D body: height 0.4, standoff 0, extent 4.5,-1.12 5.5,0.38
3D body: height 2.5, standoff 2.1, extent 14.5,0.78 15.5,1.88
3D body: height 2.5, standoff 0, extent 14.5,0.38 15.5,0.78
3D body: height 0.4, standoff 0, extent 14.5,-1.12 15.5,0.38
3D body: height 0.4, standoff 0, extent 19.5,-1.115 20.5,0.385
3D body: height 2.5, standoff 0, extent 19.5,0.385 20.5,0.785
3D body: height 2.5, standoff 2.1, extent 19.5,0.785 20.5,1.885
3D body: height 0.4, standoff 0, extent -0.5,-1.115 0.5,0.385
3D body: height 2.5, standoff 0, extent -0.5,0.385 0.5,0.785
3D body: height 2.5, standoff 2.1, extent -0.5,0.785 0.5,1.885
3D body: height 2.5, standoff 1, extent 3.45,23.18 6.45,27.68
3D body: height 2.5, standoff 1, extent 13.55,23.18 16.55,27.68
3D body: height 2.5, standoff 1, extent 18.45,23.18 22.455,27.68
3D body: height 2.5, standoff 1, extent 8.55,23.185 11.55,27.685
3D body: height 13.5, standoff 4, extent 1,23.179 19,23.979
3D body: height 4, standoff 2.5, extent -2.45,23.18 22.45,27.68
3D body: height 12.98, standoff 7, extent 1.506,6.375 7.494,23.175
3D body: height 12.98, standoff 7, extent 12.506,6.375 18.494,23.175
3D body: height 7.48, standoff 1.5, extent 12.506,6.375 18.494,23.175
3D body: height 10, standoff 4.5, extent 1.5,6.375 18.5,23.175
3D body: height 7.48, standoff 1.5, extent 1.506,6.375 7.494,23.175
3D body: height 12, standoff 4, extent -2.8,1.975 22.8,27.575
3D body: height 13.5, standoff 12, extent -2.8,1.975 6.7,27.575
3D body: height 13.5, standoff 12, extent 13.3,1.975 22.8,27.575
3D body: height 10, standoff 5, extent 3.5,5.375 16.5,24.175
3D body: height 0.4, standoff 0, extent 9.5,29.175 10.5,30.675
3D body: height 2.5, standoff 0, extent 9.5,28.775 10.5,29.175
3D body: height 2.5, standoff 2.1, extent 9.5,27.675 10.5,28.775
3D body: height 2.5, standoff 2.1, extent 14.5,27.67 15.5,28.77
3D body: height 2.5, standoff 0, extent 14.5,28.77 15.5,29.17
3D body: height 0.4, standoff 0, extent 14.5,29.17 15.5,30.67
3D body: height 2.5, standoff 2.1, extent 4.5,27.67 5.5,28.77
3D body: height 2.5, standoff 0, extent 4.5,28.77 5.5,29.17
3D body: height 0.4, standoff 0, extent 4.5,29.17 5.5,30.67
3D body: height 0.4, standoff 0, extent -0.5,29.165 0.5,30.665
3D body: height 2.5, standoff 0, extent -0.5,28.765 0.5,29.165
3D body: height 2.5, standoff 2.1, extent -0.5,27.665 0.5,28.765
3D body: height 0.4, standoff 0, extent 19.5,29.165 20.5,30.665
3D body: height 2.5, standoff 0, extent 19.5,28.765 20.5,29.165
3D body: height 2.5, standoff 2.1, extent 19.5,27.665 20.5,28.765
3D body: height 2.5, standoff 1, extent -2.455,23.18 1.55,27.68

## T-EFD25-IN [mm]
pads (6):
  rect 3x2.5 smd far side: 1(0,0) 2(5,0) 3(10,0) 4(15,0)
  rect 2x2.5 smd far side: 5(10,29.6) 6(5,29.6)
Keep-Out Layer:
  board cut-out: -5.5,28 20.5,28 20.5,1.6 -5.5,1.6
  lines w0.1: -5.5,1.6 -5.5,28 20.5,28 20.5,1.6 -5.5,1.6
3D body: height 4.39, standoff -1.6, extent 10,6.4 15.995,23.2
3D body: height 9.89, standoff 3.9, extent 10,6.4 15.995,23.2
3D body: height 10.4, standoff 8.9, extent 10.8,2 20.3,27.6
3D body: height 9.9, standoff -1.6, extent 2,6.4 13,23.2
3D body: height 6.9, standoff 1.9, extent 1,5.4 14,24.2
3D body: height 6.9, standoff 1.4, extent -1,6.4 16,23.2
3D body: height 9.89, standoff 3.9, extent -0.996,6.4 5,23.2
3D body: height 4.39, standoff -1.6, extent -0.996,6.4 5,23.2
3D body: height 8.9, standoff 0.9, extent -5.3,2 20.3,27.6
3D body: height 10.4, standoff 8.9, extent -5.3,2 4.2,27.6
3D body: height 0.9, standoff -0.6, extent -4.9,2.03 20,6.53
3D body: height 10.4, standoff 0.9, extent -1.45,5.731 16.55,6.531
3D body: height -0.6, standoff -2.1, extent 6,2.025 9,6.525
3D body: height -0.6, standoff -2.1, extent -4.905,2.03 -0.9,6.53
3D body: height -0.6, standoff -2.1, extent 16,2.03 20.005,6.53
3D body: height -0.6, standoff -2.1, extent 1,2.03 4,6.53
3D body: height -0.6, standoff -2.1, extent 11.1,2.03 14.1,6.53
3D body: height -0.6, standoff -2.1, extent 0.9,23.07 3.9,27.57
3D body: height -0.6, standoff -2.1, extent 11,23.07 14,27.57
3D body: height -0.6, standoff -2.1, extent -5.005,23.07 -1,27.57
3D body: height -0.6, standoff -2.1, extent 15.9,23.07 19.905,27.57
3D body: height -0.6, standoff -2.1, extent 6,23.075 9,27.575
3D body: height 10.4, standoff 0.9, extent -1.55,23.069 16.45,23.869
3D body: height 0.9, standoff -0.6, extent -5,23.07 19.9,27.57

## T-EFD25-IN-NO-3D [mm]
pads (6):
  rect 3x2.5 smd far side: 1(0,0) 2(5,0) 3(10,0) 4(15,0)
  rect 2x2.5 smd far side: 5(10,29.6) 6(5,29.6)

## T-EFD30-6 [mm]
pads (12):
  round 2.3 hole 1.2: 1(0,0) 2(0,-5) 3(0,-10) 4(0,-15) 5(0,-20) 6(0,-25) 7(27.5,-25) 8(27.5,-20) 9(27.5,-15) 10(27.5,-10) 11(27.5,-5) 12(27.5,0)
Top Overlay:
  lines w0.1: 1.65,-26.375 13.725,-26.375 ; 1.65,1.375 13.725,1.375 ; 13.775,-26.375 25.85,-26.375 ; 13.775,1.375 25.85,1.375
3D body: height 15.31, standoff 6.49, extent -1.6,-12.5 13.75,2.75
3D body: height 15.31, standoff 6.49, extent 13.725,-27.725 13.775,-24.475
3D body: height 15.31, standoff 6.49, extent 13.725,-0.525 13.775,2.7
3D body: height 4, standoff 2.2, extent 23.85,-9 24.85,-6
3D body: height 4, standoff 2.2, extent 23.85,-14 24.85,-11
3D body: height 4, standoff 2.2, extent 23.85,-19 24.85,-16
3D body: height 4, standoff 0, extent 23.85,-23.3 25.15,-21
3D body: height 4, standoff 0, extent 2.35,-23.3 3.65,-21
3D body: height 4, standoff 0, extent 23.85,-4 25.15,-1.7
3D body: height 4, standoff 0, extent 2.35,-4 3.65,-1.7
3D body: height 15.3, standoff 6.5, extent -1.55,-9 13.75,2.7
3D body: height 11.3, standoff 6.5, extent 2.35,-19.7 13.75,-5.3
3D body: height 15.3, standoff 6.5, extent -1.55,-27.7 13.75,-16
3D body: height 12.5, standoff 6.5, extent -1.55,-16 2.35,-9
3D body: height 12.5, standoff 6.5, extent 25.15,-16 29.05,-9
3D body: height 15.3, standoff 6.5, extent 13.75,-9 29.05,2.7
3D body: height 11.3, standoff 6.5, extent 13.75,-19.7 25.15,-5.3
3D body: height 15.3, standoff 6.5, extent 13.75,-27.7 29.05,-16
3D body: height 13, standoff 7, extent 3.65,-22.5 23.85,-2.5
3D body: height 16, standoff 4, extent 3.65,-19.51 23.85,-5.49
3D body: height 15.7, standoff 13.4, extent 2.85,-23.3 3.65,-15.3
3D body: height 15.7, standoff 13.4, extent 2.85,-9.7 3.65,-1.7
3D body: height 13.4, standoff 4, extent 2.85,-23.3 3.65,-1.7
3D body: height 6.4, standoff 4, extent -1.75,-27.5 2.85,2.5
3D body: height 6.4, standoff 4, extent 24.65,-27.5 29.25,2.5
3D body: height 13.4, standoff 4, extent 23.85,-23.3 24.65,-1.7
3D body: height 15.7, standoff 13.4, extent 23.85,-9.7 24.65,-1.7
3D body: height 15.7, standoff 13.4, extent 23.85,-23.3 24.65,-15.3
3D body: height 10, standoff 4, extent 3.65,-8.479 23.85,-2.5
3D body: height 10, standoff 4, extent 3.65,-22.5 23.85,-16.521
3D body: height 16, standoff 10, extent 3.65,-8.479 23.85,-2.5
3D body: height 16, standoff 10, extent 3.65,-22.5 23.85,-16.521
3D body: height 4, standoff 2.2, extent 2.65,-19 3.65,-16
3D body: height 4, standoff 2.2, extent 2.65,-14 3.65,-11
3D body: height 4, standoff 2.2, extent 2.65,-9 3.65,-6
3D body: height 4.5, standoff -2, extent -0.397,-0.399 0.4,0.399
3D body: height 4.5, standoff -2, extent -0.397,-5.399 0.4,-4.601
3D body: height 4.5, standoff -2, extent -0.397,-10.399 0.4,-9.601
3D body: height 4.5, standoff -2, extent -0.397,-15.399 0.4,-14.601
3D body: height 4.5, standoff -2, extent -0.397,-20.399 0.4,-19.601
3D body: height 4.5, standoff -2, extent -0.397,-25.399 0.4,-24.601
3D body: height 4.5, standoff -2, extent 27.103,-25.399 27.9,-24.601
3D body: height 4.5, standoff -2, extent 27.103,-20.399 27.9,-19.601
3D body: height 4.5, standoff -2, extent 27.103,-15.399 27.9,-14.601
3D body: height 4.5, standoff -2, extent 27.103,-10.399 27.9,-9.601
3D body: height 4.5, standoff -2, extent 27.103,-5.399 27.9,-4.601
3D body: height 4.5, standoff -2, extent 27.103,-0.399 27.9,0.399
3D body: height 15.31, standoff 6.49, extent 13.75,-12.525 29.1,2.725
3D body: height 15.31, standoff 6.49, extent -1.6,-27.75 13.75,-12.5
3D body: height 15.31, standoff 6.49, extent 13.75,-27.75 29.1,-12.5